# Altium footprint library MH_DA_THU_VIEN_16122016.PcbLib: 531 footprints (part 23 of 34)
Each footprint in its own frame and in the unit in brackets; x right, y up, seen from the top. Pads: shape width x height; smd on the part's side, far side on the other; paste and mask are expansions set on the pad; w line width, h text height; cw(c..) or ccw(c..) is an arc to the next point about the centre after c.
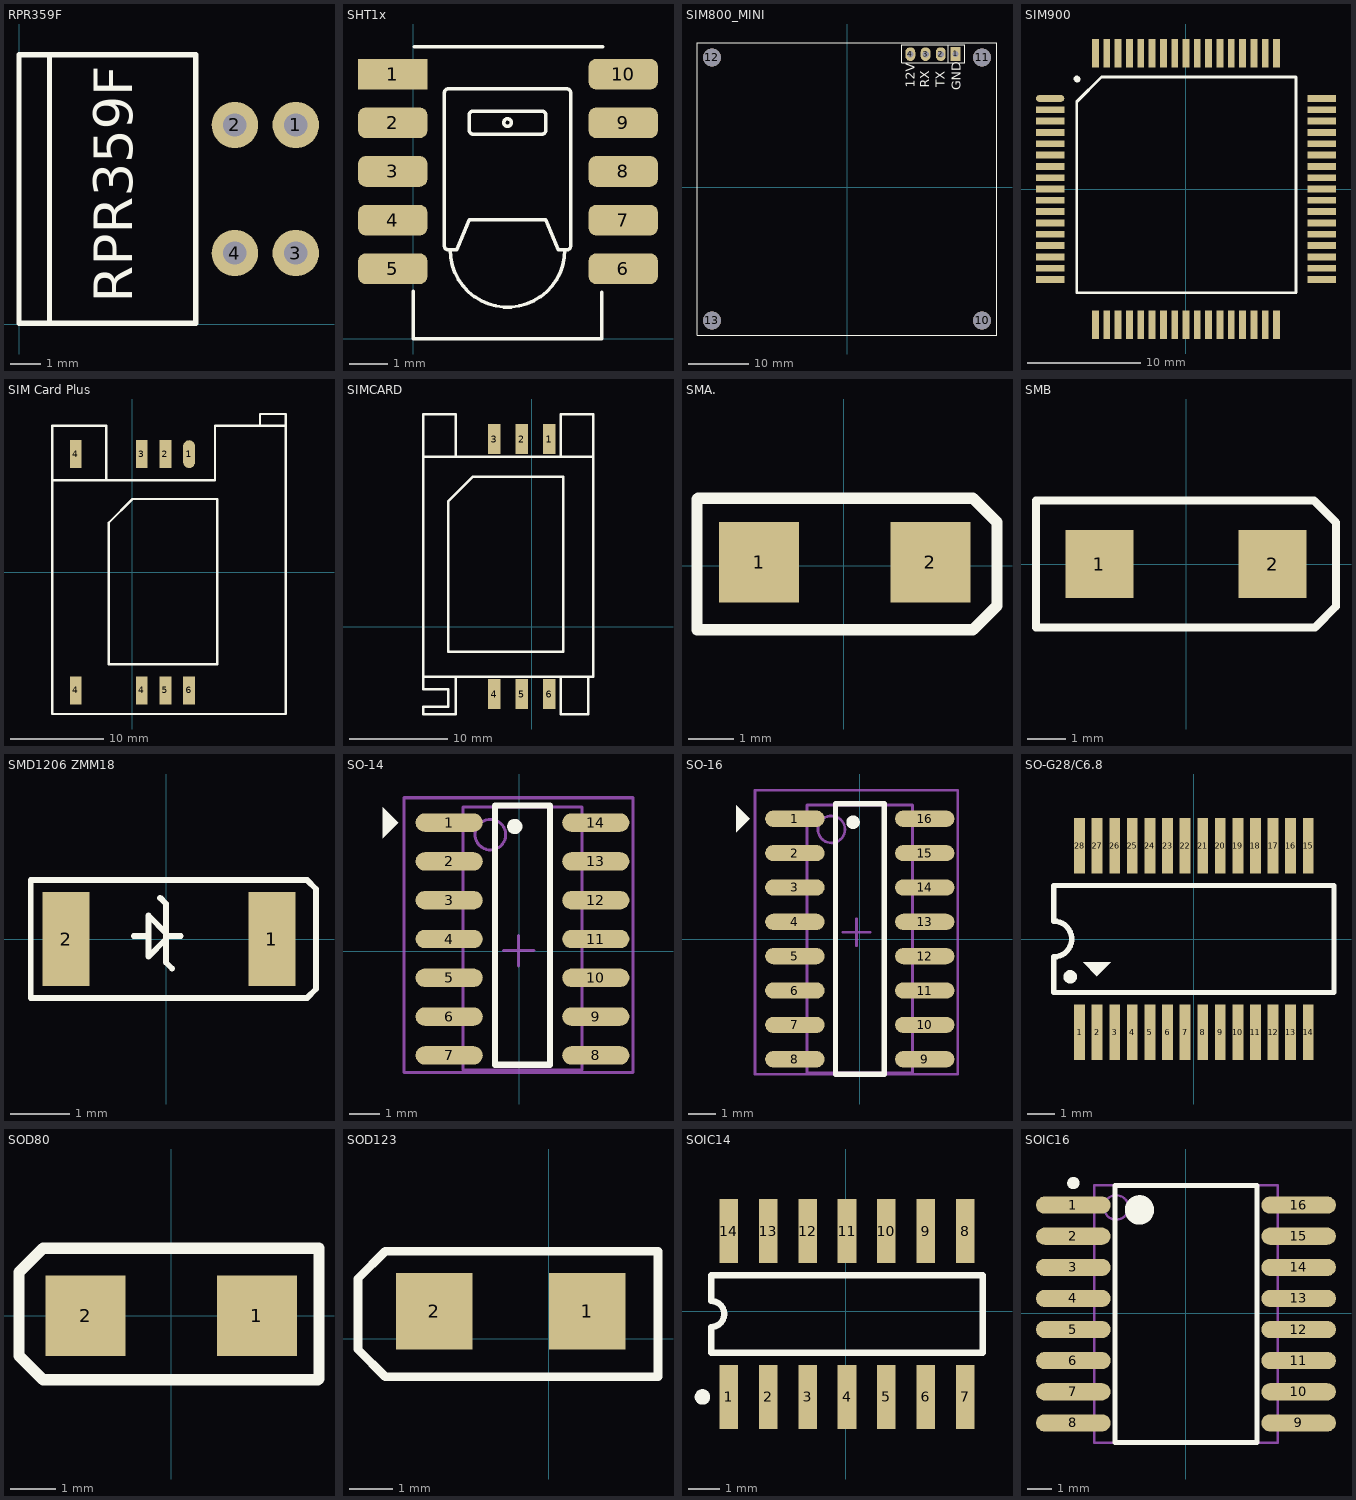
[diagram p22: the footprints below, top view; thin cyan lines are the x and y axes]

## RPR359F [mil]
pads (4):
  round 60 hole 30: 1(356.93,257.2) 2(278.19,257.2) 3(356.93,91.84) 4(278.19,91.84)
Top Overlay:
  lines w7: 38.43,347.35 38.82,347.35 38.82,1.29 ; -0.55,1.29 -0.55,347.75 227.8,347.75 227.8,1.29 -0.55,1.29
  text "RPR359F" at 145.67,27.56 h50

## SHT1x [mm] "SHT1x PCB"
pads (10):
  rect 1.815x0.8 smd: 1(-0.533,6.909)
  rrect50% 1.815x0.8 smd: 2(-0.533,5.639) 3(-0.533,4.369) 4(-0.533,3.099) 5(-0.533,1.829) 6(5.486,1.829) 7(5.486,3.099) 8(5.486,4.369) 9(5.486,5.639) 10(5.486,6.909)
Top Overlay:
  circle w0.09: c2.464,5.644 r0.1
  lines w0.09: -0.001,1.245 -0.001,0.004 4.929,0.004 4.929,1.219 ; 0.023,7.62 4.953,7.62 ; 0.964,2.324 ccw(c2.464,2.324) 3.964,2.324 ; 0.814,2.424 ccw(c0.914,2.424) 0.914,2.324 1.139,2.324 1.464,3.104 3.464,3.104 3.789,2.324 4.014,2.324 ccw(c4.014,2.424) 4.114,2.424 4.114,6.424 ccw(c4.014,6.424) 4.014,6.524 0.914,6.524 ccw(c0.914,6.424) 0.814,6.424 0.814,2.424 ; 1.464,5.444 ccw(c1.564,5.444) 1.564,5.344 3.364,5.344 ccw(c3.364,5.444) 3.464,5.444 3.464,5.844 ccw(c3.364,5.844) 3.364,5.944 1.564,5.944 ccw(c1.564,5.844) 1.464,5.844 1.464,5.444
3D body: height 2.35, standoff -0.01, extent 0.024,0 4.954,7.47

## SIM800_MINI [mm]
pads (8):
  rect 1.651x2.286 hole 1.067: 1(18.108,22.232)
  oval 1.651x2.286 hole 1.067: 2(15.644,22.207) 3(13.104,22.207) 4(10.564,22.207)
  round 3 hole 3: 10(22.523,-22.232) 11(22.527,21.648) 12(-22.527,21.648) 13(-22.527,-22.232)
Top Overlay:
  lines w0.178: 16.889,20.784 16.889,23.731 ; -25.027,-24.732 -25.027,24.137 25.023,24.137 25.023,-24.732 -25.027,-24.732 ; 9.142,20.759 9.142,23.731 19.606,23.731 19.606,20.759 9.142,20.759
  text "12V" at 11.326,16.568 h1.52
  text "RX" at 13.739,16.568 h1.52
  text "TX" at 16.33,16.695 h1.52
  text "GND" at 18.946,16.187 h1.52

## SIM900 [mm]
pads (68):
  oval 2.5x0.6 smd: 1(-12,8)
  rect 2.5x0.6 smd: 2(-12,7) 3(-12,6) 4(-12,5) 5(-12,4) 6(-12,3) 7(-12,2) 8(-12,1) 9(-12,0) 10(-12,-1) 11(-12,-2) 12(-12,-3) 13(-12,-4) 14(-12,-5) 15(-12,-6) 16(-12,-7) 17(-12,-8) 35(12,-8) 36(12,-7) 37(12,-6) 38(12,-5) 39(12,-4) 40(12,-3) 41(12,-2) 42(12,-1) 43(12,0) 44(12,1) 45(12,2) 46(12,3) 47(12,4) 48(12,5) 49(12,6) 50(12,7) 51(12,8)
  rect 0.6x2.5 smd: 18(-8,-12) 19(-7,-12) 20(-6,-12) 21(-5,-12) 22(-4,-12) 23(-3,-12) 24(-2,-12) 25(-1,-12) 26(0,-12) 27(1,-12) 28(2,-12) 29(3,-12) 30(4,-12) 31(5,-12) 32(6,-12) 33(7,-12) 34(8,-12) 52(8,12) 53(7,12) 54(6,12) 55(5,12) 56(4,12) 57(3,12) 58(2,12) 59(1,12) 60(0,12) 61(-1,12) 62(-2,12) 63(-3,12) 64(-4,12) 65(-5,12) 66(-6,12) 67(-7,12) 68(-8,12)
Top Overlay:
  lines w0.25: -9.414,-9.16 9.697,-9.16 9.717,-9.14 9.717,9.547 ; -9.325,-9.163 -9.643,-9.163 -9.653,-9.153 -9.653,7.703 -7.474,9.882 9.707,9.882 9.714,9.875 9.714,9.478
  lines w0.55: -9.65,9.73 -9.6,9.679 -9.587,9.679 -9.584,9.679 -9.577,9.687
3D body: height 3.04, standoff 0.02, extent -12,-12 12,12

## SIM Card Plus [mm]
pads (8):
  oval 1.27x3 smd: 1(6.096,12.7)
  rect 1.27x3 smd: 2(3.556,12.7) 3(1.016,12.7) 4(-6.096,-12.7) 4(-6.096,12.7) 4(1.016,-12.7) 5(3.556,-12.7) 6(6.096,-12.7)
Top Overlay:
  lines w0.254: -8.636,9.906 8.89,9.906 8.89,15.748 13.716,15.748 ; -2.794,9.906 -2.794,15.748 -8.636,15.748 -8.636,-15.24 16.51,-15.24 16.51,15.748 ; 13.716,15.748 16.51,15.748 ; 13.716,15.748 13.716,17.018 16.51,17.018 16.51,15.748 ; -2.54,-9.906 9.144,-9.906 9.144,7.874 0,7.874 -2.54,5.334 -2.54,-9.906
3D body: height 3, standoff -0.7, extent -8.436,-15.246 16.564,16.954

## SIMCARD [mil] "SOCKET Khe Cam The Sim"
pads (6):
  rect 50x118.11 smd: 1(70,750) 2(-40,750) 3(-150,750) 4(-150,-270) 5(-40,-270) 6(70,-270)
Top Overlay:
  lines w10: -305,-200 -305,-350 -435,-350 -435,-320 -405,-320 -335,-320 -335,-250 -435,-250 -435,-200 ; -305,680 -305,850 -435,850 -435,680 ; 115,-200 115,-350 225,-350 225,-200 ; 115,680 115,850 245,850 245,680 ; -435,-200 245,-200 245,680 ; -435,-200 -435,680 ; -435,680 245,680 ; -335,-100 125,-100 125,600 -235,600 -335,500 -335,-100

## SMA. [mil]
pads (2):
  rect 70x70 smd: 1(-73.86,3.11) 2(75.75,3.11)
Top Overlay:
  lines w10: -128.06,-55.89 106.94,-55.89 112.94,-55.89 133.94,-34.89 133.94,38.11 112.94,59.11 111.94,59.11 -127.06,59.11 -128.06,58.11 -128.06,-55.89
3D body: height 62.99, standoff 0, extent -71.89,-25.89 73.78,37.11

## SMB [mil]
pads (2):
  rect 70x70 smd: 1(-88.58,0) 2(88.58,0)
Top Overlay:
  lines w7.87: -153.54,-64.96 -153.54,64.96 131.04,64.96 153.54,42.46 153.54,0 153.54,-43.46 132.04,-64.96 -153.54,-64.96
3D body: height 95.17, standoff 0.48, extent -102.36,-51.19 102.37,51.17

## SMD1206 ZMM18 [mm]
pads (2):
  rect 0.8x1.6 smd: 1(1.8,0) 2(-1.7,0)
Top Overlay:
  lines w0.1: -0.55,0.05 -0.3,0.05 ; -0.1,0.7 0,0.6 0,0.5 0,0.4 0,0.3 0,0.05 0.25,0.05 ; 0.1,-0.5 0,-0.4 0,-0.3 0,-0.2 0,0.1 ; 0,0.1 0,0 -0.3,-0.3 -0.3,0.4 0,0.1 ; -2.3,-1 -2.3,1 2.4,1 2.55,0.85 2.55,-0.85 2.4,-1 -2.3,-1
3D body: height 1.25, standoff -0.25, extent -1.65,-0.75 1.85,0.75

## SO-14 [mm]
pads (14):
  oval 2.2x0.6 smd: 1(-2.298,4.216) 2(-2.298,2.946) 3(-2.298,1.676) 4(-2.298,0.406) 5(-2.298,-0.864) 6(-2.298,-2.134) 7(-2.298,-3.404) 8(2.502,-3.404) 9(2.502,-2.134) 10(2.502,-0.864) 11(2.502,0.406) 12(2.502,1.676) 13(2.502,2.946) 14(2.502,4.216)
Top Overlay:
  circle w0.25: c-0.15,4.089 r0.125
  region: -4.47,3.708 -3.962,4.216 -4.47,4.724
  lines w0.2: -0.798,-3.708 -0.798,4.771 1.002,4.771 1.002,-3.708 -0.798,-3.708
Mechanical 13:
  circle w0.1: c-0.948,3.821 r0.5
  lines w0.1: -1.848,-3.886 -1.848,4.721 2.052,4.721 2.052,-3.886 -1.848,-3.886
Mechanical 15:
  lines w0.1: -0.525,0.025 0.475,0.025 ; -0.025,-0.475 -0.025,0.525 ; -3.775,-3.962 -3.775,5.029 3.725,5.029 3.725,-3.962 -3.775,-3.962
3D body: height 1.1, standoff 0, extent -3.606,-4.703 3.694,5.497

## SO-16 [mm] "SOIC, 16-Leads, Body 9.9x3.9mm, Pitch 1.27mm, IPC Medium Density"
height 1.75
pads (16):
  oval 2.2x0.6 smd: 1(-2.4,4.445) 2(-2.4,3.175) 3(-2.4,1.905) 4(-2.4,0.635) 5(-2.4,-0.635) 6(-2.4,-1.905) 7(-2.4,-3.175) 8(-2.4,-4.445) 9(2.4,-4.445) 10(2.4,-3.175) 11(2.4,-1.905) 12(2.4,-0.635) 13(2.4,0.635) 14(2.4,1.905) 15(2.4,3.175) 16(2.4,4.445)
Top Overlay:
  circle w0.25: c-0.252,4.318 r0.125
  region: -4.572,3.937 -4.064,4.445 -4.572,4.953
  lines w0.2: -0.9,-5 -0.9,5 0.9,5 0.9,-5 -0.9,-5
Mechanical 13:
  circle w0.1: c-1.05,4.05 r0.5
  lines w0.1: -1.95,-4.95 -1.95,4.95 1.95,4.95 1.95,-4.95 -1.95,-4.95
Mechanical 15:
  lines w0.1: -0.627,0.254 0.373,0.254 ; -0.127,-0.246 -0.127,0.754 ; -3.877,-4.996 -3.877,5.504 3.623,5.504 3.623,-4.996 -3.877,-4.996
3D body: height 1.75, standoff 0, extent -1.95,-4.95 1.95,4.95

## SO-G28/C6.8 [mm] "SSOP, Plastic; 28 Leads; Body Width 5.3 mm; Pitch 0.65 mm"
height 1.99
pads (28):
  rect 0.4x2.05 smd: 1(-4.225,-3.451) 2(-3.575,-3.451) 3(-2.925,-3.451) 4(-2.275,-3.451) 5(-1.625,-3.451) 6(-0.975,-3.451) 7(-0.325,-3.451) 8(0.325,-3.451) 9(0.975,-3.451) 10(1.625,-3.451) 11(2.275,-3.451) 12(2.925,-3.451) 13(3.575,-3.451) 14(4.225,-3.451) 15(4.225,3.451) 16(3.575,3.451) 17(2.925,3.451) 18(2.275,3.451) 19(1.625,3.451) 20(0.975,3.451) 21(0.325,3.451) 22(-0.325,3.451) 23(-0.975,3.451) 24(-1.625,3.451) 25(-2.275,3.451) 26(-2.925,3.451) 27(-3.575,3.451) 28(-4.225,3.451)
Top Overlay:
  circle w0.25: c-4.57,-1.397 r0.125
  region: -4.089,-0.864 -3.581,-1.372 -3.073,-0.864
  lines w0.2: -5.175,-1.975 -5.175,-0.658 ccw(c-5.175,0) -5.175,0.658 -5.175,1.975 5.175,1.975 5.175,-1.975 -5.175,-1.975
3D body: height 0.25, standoff 0, extent -3.759,-3.429 -3.378,-2.032
3D body: height 0.25, standoff 0, extent -4.42,-3.429 -4.039,-2.032
3D body: height 1.02, standoff 0.23, extent -5.156,-1.981 5.258,2.083
3D body: height 0.25, standoff 0, extent -3.124,-3.454 -2.743,-2.057
3D body: height 0.25, standoff 0, extent -2.464,-3.454 -2.083,-2.057
3D body: height 0.25, standoff 0, extent -1.829,-3.454 -1.448,-2.057
3D body: height 0.25, standoff 0, extent -1.168,-3.454 -0.787,-2.057
3D body: height 0.25, standoff 0, extent -0.508,-3.454 -0.127,-2.057
3D body: height 0.25, standoff 0, extent 0.152,-3.454 0.533,-2.057
3D body: height 0.25, standoff 0, extent 0.762,-3.454 1.143,-2.057
3D body: height 0.25, standoff 0, extent 1.422,-3.454 1.803,-2.057
3D body: height 0.25, standoff 0, extent 2.083,-3.454 2.464,-2.057
3D body: height 0.25, standoff 0, extent 2.743,-3.454 3.124,-2.057
3D body: height 0.25, standoff 0, extent 3.378,-3.454 3.759,-2.057
3D body: height 0.25, standoff 0, extent 4.039,-3.454 4.42,-2.057
3D body: height 0.25, standoff 0, extent 4.039,2.007 4.42,3.404
3D body: height 0.25, standoff 0, extent 3.378,2.007 3.759,3.404
3D body: height 0.25, standoff 0, extent 2.743,2.007 3.124,3.404
3D body: height 0.25, standoff 0, extent 2.083,2.007 2.464,3.404
3D body: height 0.25, standoff 0, extent 1.422,2.007 1.803,3.404
3D body: height 0.25, standoff 0, extent 0.762,2.007 1.143,3.404
3D body: height 0.25, standoff 0, extent 0.152,2.007 0.533,3.404
3D body: height 0.25, standoff 0, extent -0.508,2.007 -0.127,3.404
3D body: height 0.25, standoff 0, extent -1.168,2.007 -0.787,3.404
3D body: height 0.25, standoff 0, extent -1.829,2.007 -1.448,3.404
3D body: height 0.25, standoff 0, extent -2.464,2.007 -2.083,3.404
3D body: height 0.25, standoff 0, extent -3.124,2.007 -2.743,3.404
3D body: height 0.25, standoff 0, extent -4.42,2.032 -4.039,3.429
3D body: height 0.25, standoff 0, extent -3.759,2.032 -3.378,3.429
3D body: height 1.27, standoff 1.02, extent -2.032,-0.305 -1.245,1.092
3D body: height 1.27, standoff 1.02, extent -3.175,-0.305 -2.354,1.101
3D body: height 1.27, standoff 1.02, extent -0.925,-0.305 -0.094,1.101
3D body: height 1.27, standoff 1.02, extent 0.254,-0.31 1.173,1.092
3D body: height 1.27, standoff 1.02, extent 1.516,-0.313 2.548,1.099
3D body: height 1.27, standoff 1.02, extent 2.794,-0.335 3.713,1.067
3D body: height 1.14, standoff 1.02, extent -4.809,-1.753 -4.291,-1.235

## SOD80 [mil]
pads (2):
  rect 70x70 smd: 1(74.8,0) 2(-74.8,0)
Top Overlay:
  lines w10: -133,-35 -133,38 -112,59 -106,59 129,59 129,-55 128,-56 -111,-56 -112,-56 -133,-35
3D body: height 62.99, standoff 0, extent -72.84,-34 72.84,29

## SOD123 [mil]
pads (2):
  rect 70x70 smd: 1(35,25) 2(-105,25)
Top Overlay:
  lines w7.87: -175,-10 -150,-35 100,-35 100,80 -150,80 -175,55 -175,36.97 -175,-10
3D body: height 95.17, standoff 0.48, extent -138.59,-28.97 66.13,73.39

## SOIC14 [mm]
pads (14):
  rect 0.6x2.05 smd: 1(-3.774,-2.761) 2(-2.504,-2.761) 3(-1.234,-2.761) 4(0.036,-2.761) 5(1.306,-2.761) 6(2.576,-2.761) 7(3.846,-2.761) 8(3.846,2.589) 9(2.576,2.589) 10(1.306,2.589) 11(0.036,2.589) 12(-1.234,2.589) 13(-2.504,2.589) 14(-3.774,2.589)
Top Overlay:
  circle w0.25: c-4.624,-2.761 r0.125
  lines w0.2: -4.339,-1.336 -4.339,-0.502 ccw(c-4.339,-0.086) -4.339,0.331 -4.339,1.164 4.411,1.164 4.411,-1.336 -4.339,-1.336
3D body: height 1.75, standoff 0, extent -4.356,-3.025 4.394,2.975

## SOIC16 [mm]
pads (16):
  oval 3.048x0.7 smd: 1(-4.6,4.42) 2(-4.6,3.15) 3(-4.6,1.88) 4(-4.6,0.61) 5(-4.6,-0.66) 6(-4.6,-1.93) 7(-4.6,-3.2) 8(-4.6,-4.47) 9(4.6,-4.47) 10(4.6,-3.2) 11(4.6,-1.93) 12(4.6,-0.66) 13(4.6,0.61) 14(4.6,1.88) 15(4.6,3.15) 16(4.6,4.42)
Top Overlay:
  circle w0.6: c-1.9,4.225 r0.3
  circle w0.25: c-4.6,5.32 r0.125
  lines w0.2: -2.9,-5.275 2.9,-5.275 2.9,5.225 -2.9,5.225 -2.9,-5.275
Mechanical 13:
  circle w0.1: c-2.85,4.325 r0.5
  lines w0.1: -3.75,-5.275 3.75,-5.275 3.75,5.225 -3.75,5.225 -3.75,-5.275
3D body: height 2.62, standoff -0.03, extent -5.34,-5.301 5.29,5.199